# Altium footprint library PcbLibUltimate (1).pcblib: 202 footprints (part 10 of 13)
Each footprint in its own frame and in the unit in brackets; x right, y up, seen from the top. Pads: shape width x height; smd on the part's side, far side on the other; paste and mask are expansions set on the pad; w line width, h text height; cw(c..) or ccw(c..) is an arc to the next point about the centre after c.
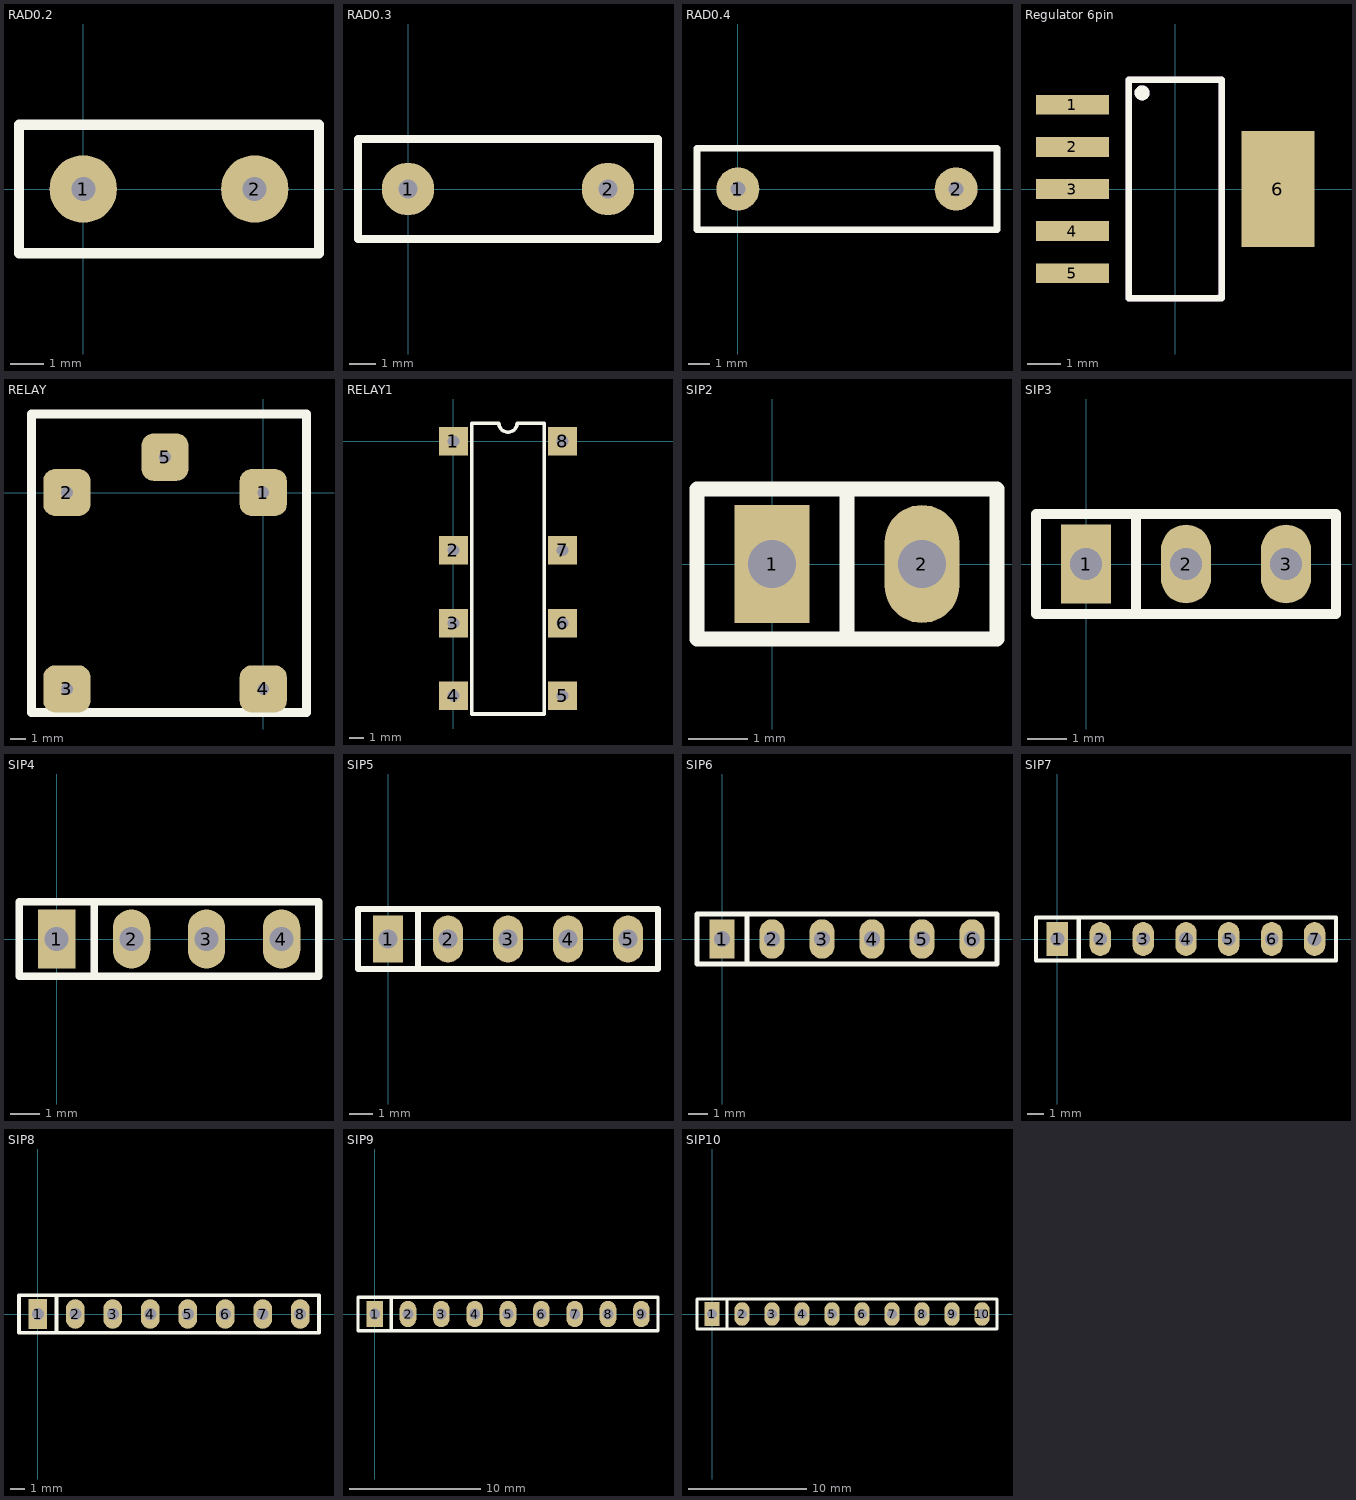
[diagram p9: the footprints below, top view; thin cyan lines are the x and y axes]

## RAD0.2 [mm]
pads (2):
  round 2 hole 0.711: 1(0,0) 2(5.08,0)
Top Overlay:
  lines w0.305: -1.905,-1.905 -1.905,1.905 6.985,1.905 6.985,-1.905 -1.905,-1.905

## RAD0.3 [mm]
pads (2):
  round 2 hole 0.711: 1(0,0) 2(7.62,0)
Top Overlay:
  lines w0.305: -1.905,-1.905 -1.905,1.905 9.525,1.905 9.525,-1.905 -1.905,-1.905

## RAD0.4 [mm]
pads (2):
  round 2 hole 0.711: 1(0,0) 2(10.16,0)
Top Overlay:
  lines w0.305: -1.905,-1.905 12.065,-1.905 12.065,1.905 -1.905,1.905 -1.905,-1.905

## Regulator 6pin [mm]
pads (6):
  rect 2.2x0.6 smd: 1(-3.1,2.54) 2(-3.1,1.27) 3(-3.1,0) 4(-3.1,-1.27) 5(-3.1,-2.54)
  rect 2.2x3.5 smd: 6(3.1,0)
Top Overlay:
  circle w0.254: c-1,2.9 r0.1
  lines w0.2: -1.4,-3.3 1.4,-3.3 1.4,3.3 -1.4,3.3 -1.4,-3.3
Mechanical 29:
  circle w0.254: c-1,2.9 r0.1
  lines w0.2: -1.4,-3.3 -1.4,3.3 1.4,3.3 1.4,-3.2 1.3,-3.3 -1.4,-3.3
  text "'.Designator'" at 1,-1.8 h1.52
3D body "User Library-TPS73701DCQ.step": height 1.8, standoff 0, extent -3.63,-3.275 3.63,3.275

## RELAY [mm]
pads (5):
  rrect50% 3x3 hole 0.762: 1(0,0) 2(-12.5,0) 3(-12.5,-12.5) 4(0,-12.5) 5(-6.25,2.25)
Top Overlay:
  lines w0.554: -14.75,-14 -14.75,3.75 -14.75,5 2.75,5 2.75,3.75 2.75,-14 -14.75,-14
Mechanical 29:
  lines w0.2: -14.732,-14.097 -14.732,4.953 2.54,4.953 2.667,4.826 2.667,-13.843 -14.478,-13.843 -14.732,-14.097
3D body "nff-NF8 3D 1NO PDF.step": height 15.3, standoff -3.9, extent -14.1,-15.723 1.4,3.277

## RELAY1 [mm]
pads (8):
  rect 2x2 hole 0.813: 1(0,0) 2(0,-7.62) 3(0,-12.7) 4(0,-17.78) 5(7.62,-17.78) 6(7.62,-12.7) 7(7.62,-7.62) 8(7.62,0)
Top Overlay:
  lines w0.254: 1.27,-19.05 6.35,-19.05 6.35,1.27 4.445,1.27 cw(c3.81,1.27) 3.175,1.27 1.27,1.27 1.27,-19.05

## Relay Module [mil]
3D body "CircuitWorks-5MM LED RED.step": height 338.58, standoff -196.85, extent 1320.87,844.49 1521.66,1045.28
3D body "CircuitWorks-5MM LED RED.step": height 338.58, standoff -196.85, extent 458.66,850.39 659.45,1051.18
3D body "User Library-Terminal block 2 POS.STEP": height 393.7, standoff -120, extent 1217.33,208.67 1617.33,503.94
3D body "User Library-Terminal block 2 POS.STEP": height 393.7, standoff -120, extent 351.19,204.73 751.19,500.01
3D body: height 7.87, standoff 0, extent 0,0 2007.87,2007.87
3D body "User Library-Terminal block 2 POS.STEP": height 393.7, standoff -120, extent 772.44,1653.54 1172.44,1948.82

## SIP2 [mil]
pads (2):
  rect 50x78.74 hole 32: 1(0,0)
  oval 50x78.74 hole 32: 2(100,0)
Top Overlay:
  lines w10: 50,-50 50,50 ; -50,-50 -50,50 150,50 150,-50 -50,-50

## SIP3 [mil]
pads (3):
  rect 50x78.74 hole 32: 1(0,0)
  oval 50x78.74 hole 32: 2(100,0) 3(200,0)
Top Overlay:
  lines w10: 50,-50 50,50 ; -50,-50 250,-50 250,50 -50,50 -50,-50

## SIP4 [mil]
pads (4):
  rect 50x78.74 hole 32: 1(0,0)
  oval 50x78.74 hole 32: 2(100,0) 3(200,0) 4(300,0)
Top Overlay:
  lines w10: 50,-50 50,50 ; -50,-50 350,-50 350,50 -50,50 -50,-50

## SIP5 [mil]
pads (5):
  rect 50x78.74 hole 32: 1(0,0)
  oval 50x78.74 hole 32: 2(100,0) 3(200,0) 4(300,0) 5(400,0)
Top Overlay:
  lines w10: 50,-50 50,50 ; -50,-50 -50,50 450,50 450,-50 -50,-50

## SIP6 [mil]
pads (6):
  rect 50x78.74 hole 32: 1(0,0)
  oval 50x78.74 hole 32: 2(100,0) 3(200,0) 4(300,0) 5(400,0) 6(500,0)
Top Overlay:
  lines w10: 50,-50 50,50 ; -50,-50 550,-50 550,50 -50,50 -50,-50

## SIP7 [mil]
pads (7):
  rect 50x78.74 hole 32: 1(0,0)
  oval 50x78.74 hole 32: 2(100,0) 3(200,0) 4(300,0) 5(400,0) 6(500,0) 7(600,0)
Top Overlay:
  lines w10: 50,-50 50,50 ; -50,-50 650,-50 650,50 -50,50 -50,-50

## SIP8 [mil]
pads (8):
  rect 50x78.74 hole 32: 1(0,0)
  oval 50x78.74 hole 32: 2(100,0) 3(200,0) 4(300,0) 5(400,0) 6(500,0) 7(600,0) 8(700,0)
Top Overlay:
  lines w10: 50,-50 50,50 ; -50,-50 750,-50 750,50 -50,50 -50,-50

## SIP9 [mil]
pads (9):
  rect 50x78.74 hole 32: 1(0,0)
  oval 50x78.74 hole 32: 2(100,0) 3(200,0) 4(300,0) 5(400,0) 6(500,0) 7(600,0) 8(700,0) 9(800,0)
Top Overlay:
  lines w10: 50,-50 50,50 ; -50,-50 -50,50 850,50 850,-50 -50,-50

## SIP10 [mil]
pads (10):
  rect 50x78.74 hole 32: 1(0,0)
  oval 50x78.74 hole 32: 2(100,0) 3(200,0) 4(300,0) 5(400,0) 6(500,0) 7(600,0) 8(700,0) 9(800,0) 10(900,0)
Top Overlay:
  lines w10: 50,-50 50,50 ; -50,-50 -50,50 950,50 950,-50 -50,-50